# Altium footprint library CPU_STM_080816.PcbLib: 220 footprints (part 11 of 16)
Each footprint in its own frame and in the unit in brackets; x right, y up, seen from the top. Pads: shape width x height; smd on the part's side, far side on the other; paste and mask are expansions set on the pad; w line width, h text height; cw(c..) or ccw(c..) is an arc to the next point about the centre after c.
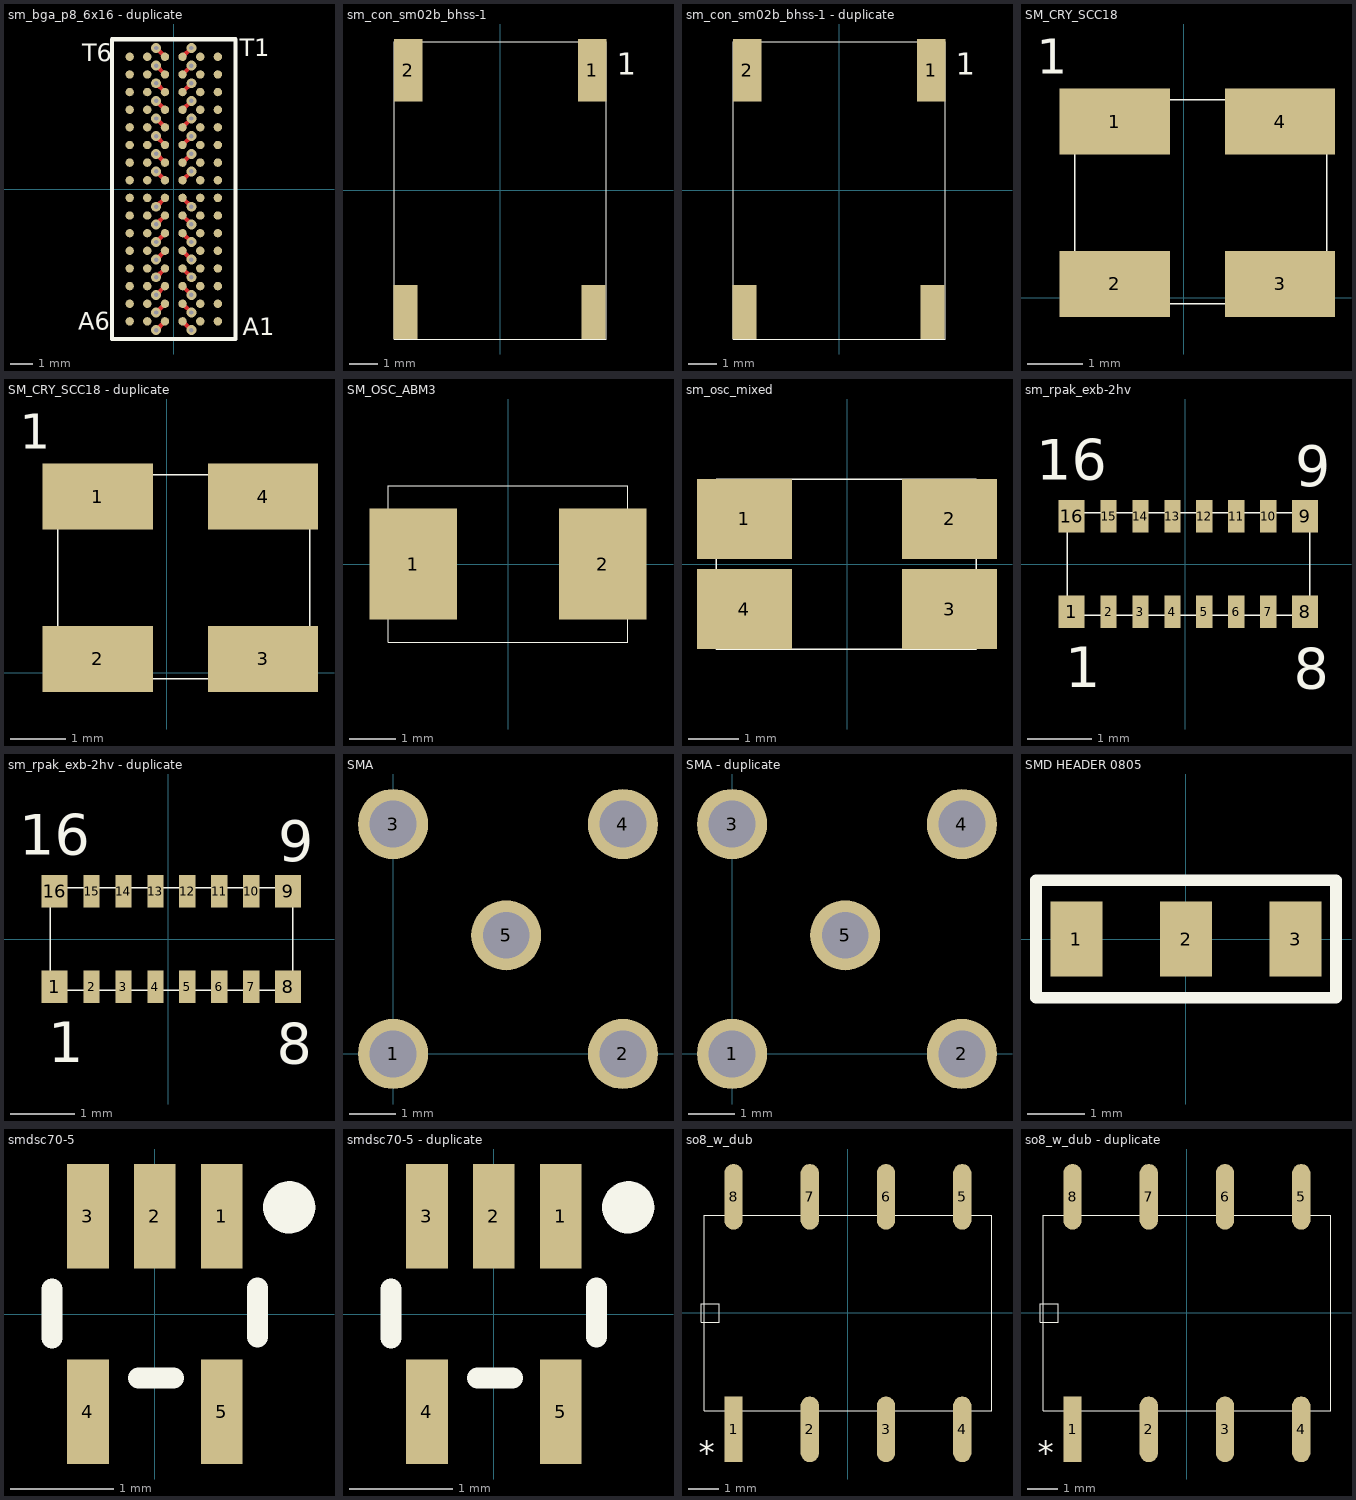
[diagram p10: the footprints below, top view; thin cyan lines are the x and y axes]

## sm_bga_p8_6x16 - duplicate [mm] "SM_BGA_P8_6X16"
pads (96):
  round 0.381 smd mask+0.06: A1(2,-6) A2(1.2,-6) A3(0.4,-6) A4(-0.4,-6) A5(-1.2,-6) A6(-2,-6) B1(2,-5.2) B2(1.2,-5.2) B3(0.4,-5.2) B4(-0.4,-5.2) B5(-1.2,-5.2) B6(-2,-5.2) C1(2,-4.4) C2(1.2,-4.4) C3(0.4,-4.4) C4(-0.4,-4.4) C5(-1.2,-4.4) C6(-2,-4.4) D1(2,-3.6) D2(1.2,-3.6) D3(0.4,-3.6) D4(-0.4,-3.6) D5(-1.2,-3.6) D6(-2,-3.6) E1(2,-2.8) E2(1.2,-2.8) E3(0.4,-2.8) E4(-0.4,-2.8) E5(-1.2,-2.8) E6(-2,-2.8) F1(2,-2) F2(1.2,-2) F3(0.4,-2) F4(-0.4,-2) F5(-1.2,-2) F6(-2,-2) G1(2,-1.2) G2(1.2,-1.2) G3(0.4,-1.2) G4(-0.4,-1.2) G5(-1.2,-1.2) G6(-2,-1.2) H1(2,-0.4) H2(1.2,-0.4) H3(0.4,-0.4) H4(-0.4,-0.4) H5(-1.2,-0.4) H6(-2,-0.4) J1(2,0.4) J2(1.2,0.4) J3(0.4,0.4) J4(-0.4,0.4) J5(-1.2,0.4) J6(-2,0.4) K1(2,1.2) K2(1.2,1.2) K3(0.4,1.2) K4(-0.4,1.2) K5(-1.2,1.2) K6(-2,1.2) L1(2,2) L2(1.2,2) L3(0.4,2) L4(-0.4,2) L5(-1.2,2) L6(-2,2) M1(2,2.8) M2(1.2,2.8) M3(0.4,2.8) M4(-0.4,2.8) M5(-1.2,2.8) M6(-2,2.8) N1(2,3.6) N2(1.2,3.6) N3(0.4,3.6) N4(-0.4,3.6) N5(-1.2,3.6) N6(-2,3.6) P1(2,4.4) P2(1.2,4.4) P3(0.4,4.4) P4(-0.4,4.4) P5(-1.2,4.4) P6(-2,4.4) R1(2,5.2) R2(1.2,5.2) R3(0.4,5.2) R4(-0.4,5.2) R5(-1.2,5.2) R6(-2,5.2) T1(2,6) T2(1.2,6) T3(0.4,6) T4(-0.4,6) T5(-1.2,6) T6(-2,6)
via 0.8,-4.8 diameter 0.45 hole 0.2
via 0.8,-2.4 diameter 0.45 hole 0.2
via 0.8,2.4 diameter 0.45 hole 0.2
via 0.8,4.8 diameter 0.45 hole 0.2
via -0.8,-4.8 diameter 0.45 hole 0.2
via -0.8,-2.4 diameter 0.45 hole 0.2
via -0.8,2.4 diameter 0.45 hole 0.2
via -0.8,4.8 diameter 0.45 hole 0.2
via -0.8,-6.4 diameter 0.45 hole 0.2
via -0.8,-0.8 diameter 0.45 hole 0.2
via -0.8,0.8 diameter 0.45 hole 0.2
via -0.8,6.4 diameter 0.45 hole 0.2
via -0.8,-5.6 diameter 0.45 hole 0.2
via -0.8,-4 diameter 0.45 hole 0.2
via -0.8,-3.2 diameter 0.45 hole 0.2
via -0.8,-1.6 diameter 0.45 hole 0.2
via -0.8,1.6 diameter 0.45 hole 0.2
via -0.8,3.2 diameter 0.45 hole 0.2
via -0.8,5.6 diameter 0.45 hole 0.2
via -0.8,4 diameter 0.45 hole 0.2
via 0.8,-6.4 diameter 0.45 hole 0.2
via 0.8,-5.6 diameter 0.45 hole 0.2
via 0.8,-4 diameter 0.45 hole 0.2
via 0.8,-3.2 diameter 0.45 hole 0.2
via 0.8,-1.6 diameter 0.45 hole 0.2
via 0.8,-0.8 diameter 0.45 hole 0.2
via 0.8,0.8 diameter 0.45 hole 0.2
via 0.8,1.6 diameter 0.45 hole 0.2
via 0.8,3.2 diameter 0.45 hole 0.2
via 0.8,6.4 diameter 0.45 hole 0.2
via 0.8,4 diameter 0.45 hole 0.2
via 0.8,5.6 diameter 0.45 hole 0.2
Top Layer:
  lines w0.2: -0.8,-6.4 -0.4,-6 ; -0.8,-5.6 -0.4,-5.2 ; -0.8,-4.8 -0.4,-4.4 ; -0.8,-4 -0.4,-3.6 ; -0.8,-3.2 -0.4,-2.8 ; -0.8,-2.4 -0.4,-2 ; -0.8,-1.6 -0.4,-1.2 ; -0.8,-0.8 -0.4,-0.4 ; -0.8,0.8 -0.4,0.4 ; -0.8,1.6 -0.4,1.2 ; -0.8,2.4 -0.4,2 ; -0.8,3.2 -0.4,2.8 ; -0.8,4 -0.4,3.6 ; -0.8,4.8 -0.4,4.4 ; -0.8,5.6 -0.4,5.2 ; -0.8,6.4 -0.4,6 ; 0.4,-6 0.8,-6.4 ; 0.4,-5.2 0.8,-5.6 ; 0.4,-4.4 0.8,-4.8 ; 0.4,-3.6 0.8,-4 ; 0.4,-2.8 0.8,-3.2 ; 0.4,-2 0.8,-2.4 ; 0.4,-1.2 0.8,-1.6 ; 0.4,-0.4 0.8,-0.8 ; 0.4,0.4 0.8,0.8 ; 0.4,1.2 0.8,1.6 ; 0.4,2 0.8,2.4 ; 0.4,2.8 0.8,3.2 ; 0.4,3.6 0.8,4 ; 0.4,4.4 0.8,4.8 ; 0.4,5.2 0.8,5.6 ; 0.4,6 0.8,6.4
Top Overlay:
  lines w0.2: -2.8,-6.8 -2.8,6.8 2.8,6.8 2.8,-6.8 -2.8,-6.8
  text "A6" at -4.343,-6.375 h0.79
  text "A1" at 3.124,-6.629 h0.79
  text "T1" at 2.997,6.02 h0.79
  text "T6" at -4.14,5.791 h0.79

## sm_con_sm02b_bhss-1 [mm] "SM_CON_SM02B_BHSS-1"
pads (4):
  rect 1x2.2 smd: 1(3.25,4.25) 2(-3.25,4.25)
  rect 0.85x1.9 smd: " "(-3.35,-4.3) " "(3.3,-4.3)
Top Overlay:
  lines w0.025: -3.75,-5.25 -3.75,5.25 3.75,5.25 3.75,-5.25 -3.75,-5.25
  text "1" at 4.115,4.089 h0.79

## sm_con_sm02b_bhss-1 - duplicate [mm] "SM_CON_SM02B_BHSS-1"
pads (4):
  rect 1x2.2 smd: 1(3.25,4.25) 2(-3.25,4.25)
  rect 0.85x1.9 smd: " "(-3.35,-4.3) " "(3.3,-4.3)
Top Overlay:
  lines w0.025: -3.75,-5.25 3.75,-5.25 3.75,5.25 -3.75,5.25 -3.75,-5.25
  text "1" at 4.115,4.089 h0.79

## SM_CRY_SCC18 [mm] "SM_CRY_SCC18"
pads (4):
  rect 2x1.2 smd: 1(-1.25,3.2) 2(-1.25,0.254) 3(1.75,0.254) 4(1.75,3.2)
Top Overlay:
  lines w0.025: -1.981,-0.102 2.6,-0.102 2.6,3.6 -1.981,3.6 -1.981,-0.102
  text "1" at -2.667,4.064 h0.64

## SM_CRY_SCC18 - duplicate [mm] "SM_CRY_SCC18"
pads (4):
  rect 2x1.2 smd: 1(-1.25,3.2) 2(-1.25,0.254) 3(1.75,0.254) 4(1.75,3.2)
Top Overlay:
  lines w0.025: -1.981,-0.102 2.6,-0.102 2.6,3.6 -1.981,3.6 -1.981,-0.102
  text "1" at -2.667,4.064 h0.64

## SM_OSC_ABM3 [mm] "SM_OSC_ABM3"
pads (2):
  rect 1.9x2.4 smd: 1(-2.05,0) 2(2.05,0)
Top Overlay:
  lines w0.025: -2.6,-1.7 -2.6,1.7 2.6,1.7 2.6,-1.7 -2.6,-1.7
3D body "User Library-Xtal-ABM7.STEP": height 1.44, standoff 0.04, extent -3.075,-1.85 3.125,1.85

## sm_osc_mixed [mm]
pads (4):
  rect 1.9x1.6 smd: 1(-2.05,0.9) 2(2.05,0.9) 3(2.05,-0.9) 4(-2.05,-0.9)
Top Overlay:
  lines w0.025: -2.618,-1.701 2.582,-1.701 2.582,1.699 -2.618,1.699 -2.618,-1.701
3D body "User Library-Xtal-ABM7.STEP": height 1.44, standoff 0.04, extent -3.1,-1.854 3.1,1.846

## sm_rpak_exb-2hv [mil] "SM_RPAK_EXB-2HV"
pads (16):
  rect 16x20 smd mask+2.36: 1(-70.08,-29.53) 8(74.02,-29.53) 9(74.02,29.53) 16(-70.08,29.53)
  rect 10x20 smd mask+2.36: 2(-47.24,-29.53) 3(-27.56,-29.53) 4(-7.87,-29.53) 5(11.81,-29.53) 6(31.5,-29.53) 7(51.18,-29.53) 10(51.18,29.53) 11(31.5,29.53) 12(11.81,29.53) 13(-7.87,29.53) 14(-27.56,29.53) 15(-47.24,29.53)
Top Overlay:
  lines w1: -72.83,-31.5 -72.83,31.5 76.77,31.5 76.77,-31.5 -72.83,-31.5
  text "1" at -74,-76 h25
  text "8" at 67,-77 h25
  text "9" at 68,48 h25
  text "16" at -92,52 h25

## sm_rpak_exb-2hv - duplicate [mil] "SM_RPAK_EXB-2HV"
pads (16):
  rect 16x20 smd mask+2.36: 1(-70.08,-29.53) 8(74.02,-29.53) 9(74.02,29.53) 16(-70.08,29.53)
  rect 10x20 smd mask+2.36: 2(-47.24,-29.53) 3(-27.56,-29.53) 4(-7.87,-29.53) 5(11.81,-29.53) 6(31.5,-29.53) 7(51.18,-29.53) 10(51.18,29.53) 11(31.5,29.53) 12(11.81,29.53) 13(-7.87,29.53) 14(-27.56,29.53) 15(-47.24,29.53)
Top Overlay:
  lines w1: -72.83,-31.5 76.77,-31.5 76.77,31.5 -72.83,31.5 -72.83,-31.5
  text "16" at -92,52 h25
  text "9" at 68,48 h25
  text "8" at 67,-77 h25
  text "1" at -74,-76 h25

## SMA [mil]
pads (5):
  round 60 hole 40: 1(0,0) 2(196.85,0) 3(0,196.85) 4(196.85,196.85) 5(96.85,101.57)
3D body "SMA-J-P-H-RA-TH1.step": height 427.56, standoff -127.75, extent -40.95,-36.22 553.54,239.37

## SMA - duplicate [mil]
pads (5):
  round 60 hole 40: 1(0,0) 2(196.85,0) 3(0,196.85) 4(196.85,196.85) 5(96.85,101.57)

## SMD HEADER 0805 [mm]
pads (3):
  rect 0.9x1.3 smd: 1(-1.9,0) 2(0,0) 3(1.9,0)
Top Overlay:
  lines w0.2: -2.6,-1.016 2.6,-1.016 2.6,1.016 -2.6,1.016 -2.6,-1.016
3D body "User Library-RES_2013-0805.step": height 0.76, standoff 0, extent -2.1,-0.675 0.2,0.675

## smdsc70-5 [mil] "SMDSC70-5"
pads (5):
  rect 16x40 smd mask+2.36: 1(25.59,37.4) 2(0,37.4) 3(-25.59,37.4) 4(-25.59,-37.4) 5(25.59,-37.4)
Top Overlay:
  circle w10: c51.45,40.82 r5
  lines w8: -39.4,-9.22 -39.4,9.61 ; -6.18,-24.52 7.17,-24.52 ; 39.34,-8.81 39.34,10.02

## smdsc70-5 - duplicate [mil] "SMDSC70-5"
pads (5):
  rect 16x40 smd mask+2.36: 1(25.59,37.4) 2(0,37.4) 3(-25.59,37.4) 4(-25.59,-37.4) 5(25.59,-37.4)
Top Overlay:
  circle w10: c51.45,40.82 r5
  lines w8: -39.4,-9.22 -39.4,9.61 ; -6.18,-24.52 7.17,-24.52 ; 39.34,-8.81 39.34,10.02

## so8_w_dub [mil] "SO8_W_DUB"
pads (8):
  rect 24x86 smd: 1(-150,-152.75)
  oval 24x86 smd: 2(-50,-152.75) 3(50,-152.75) 4(150,-152.75) 5(150,152.25) 6(50,152.25) 7(-50,152.25) 8(-150,152.25)
Top Overlay:
  lines w1: -192.5,-12.25 -168.5,-12.25 -168.5,11.75 -192.5,11.75 -192.5,-12.25 ; -188.5,-128.25 172.83,-128.7 188.5,-128.25 188.5,127.75 -188.5,127.75 -188.5,-128.25
  text "*" at -195.4,-198.25 h31

## so8_w_dub - duplicate [mil] "SO8_W_DUB"
pads (8):
  rect 24x86 smd: 1(-150,-152.75)
  oval 24x86 smd: 2(-50,-152.75) 3(50,-152.75) 4(150,-152.75) 5(150,152.25) 6(50,152.25) 7(-50,152.25) 8(-150,152.25)
Top Overlay:
  lines w1: -192.5,-12.25 -168.5,-12.25 -168.5,11.75 -192.5,11.75 -192.5,-12.25 ; -188.5,-128.25 172.83,-128.7 188.5,-128.25 188.5,127.75 -188.5,127.75 -188.5,-128.25
  text "*" at -195.4,-198.25 h31